# Altium footprint library Main_Board.PcbLib: 106 footprints (part 3 of 7)
Each footprint in its own frame and in the unit in brackets; x right, y up, seen from the top. Pads: shape width x height; smd on the part's side, far side on the other; paste and mask are expansions set on the pad; w line width, h text height; cw(c..) or ccw(c..) is an arc to the next point about the centre after c.
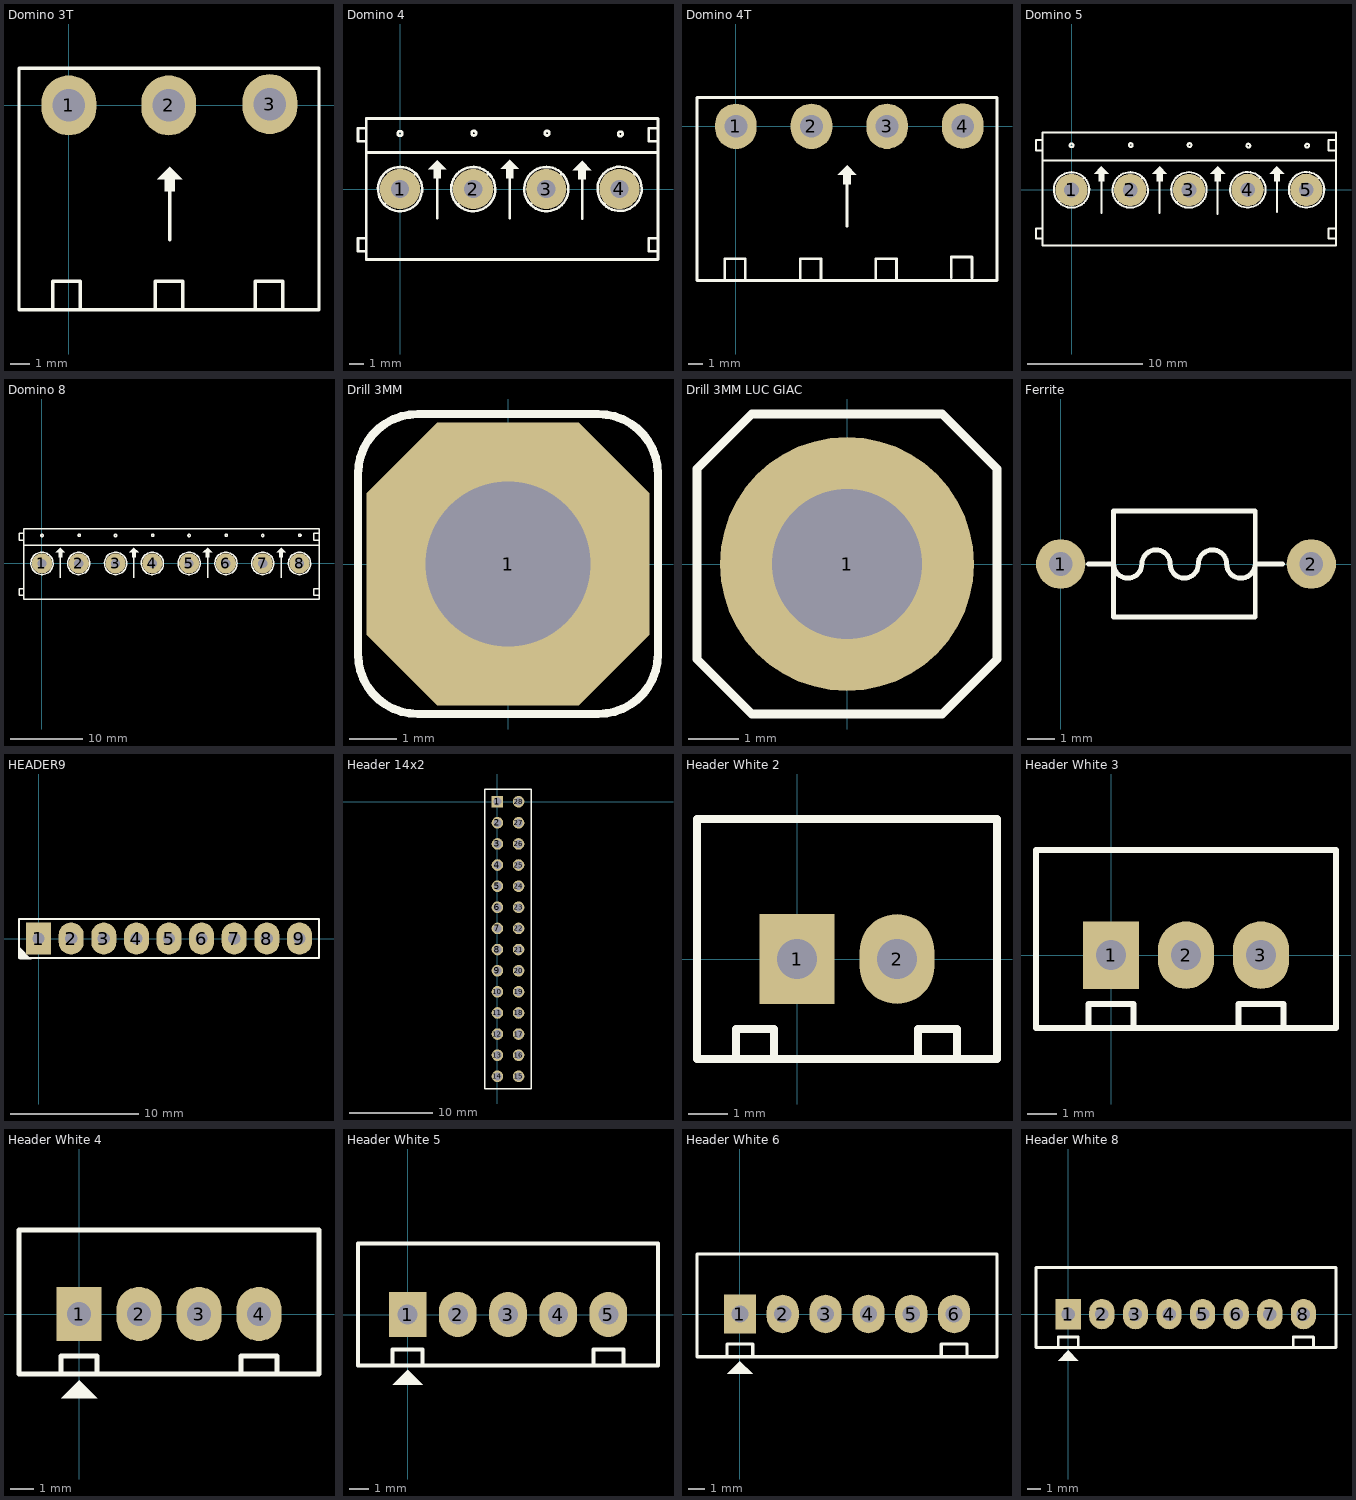
[diagram p2: the footprints below, top view; thin cyan lines are the x and y axes]

## Domino 3T [mil] "Domino 3T, 3 pin, hight 300mil, Pin to Pin 200, Colour Green"
height 300
pads (3):
  oval 110x120 hole 65: 1(0,0) 2(200,0) 3(402.62,2.62)
Top Overlay:
  region: 202,-122.5 177,-147.5 192,-147.5 192,-172.5 212,-172.5 212,-147.5 227,-147.5
  lines w7: -32,-407 -32,-352 23,-352 23,-407 ; 173,-407 173,-352 228,-352 228,-407 ; 202,-269 202,-172.5 ; 373,-407 373,-352 428,-352 428,-407 ; -100,-409 501,-409 501,74 -100,74 -100,-409
3D body "User Library-BigHeader 5EHDR_1P.step": height 124.02, standoff -366.97, extent -95,-404 101.85,68.44
3D body "User Library-BigHeader 5EHDR_1P.step": height 124.02, standoff -366.97, extent 102,-404 298.85,68.44
3D body "User Library-BigHeader 5EHDR_1P.step": height 124.02, standoff -366.97, extent 299,-404.22 495.85,68.22

## Domino 4 [mil] "Domino 4, 4 pin, height 300mil, Pin to Pin 200, Colour Green"
height 300
pads (4):
  round 110 hole 50: 1(0,0) 2(200,0) 3(400,0.06) 4(600,0.39)
Top Overlay:
  circle w7: c602.6,151 r6.4
  circle w7: c402,153 r6.4
  circle w7: c0,152 r6.4
  circle w7: c202,153 r6.4
  region: 300,80 275,55 290,55 290,30 310,30 310,55 325,55
  region: 102,79 77,54 92,54 92,29 112,29 112,54 127,54
  region: 498,77 473,52 488,52 488,27 508,27 508,52 523,52
  lines w7: -93,-169.5 -115,-169.5 -115,-134.5 -93,-134.5 ; -93,131 -115,131 -115,166 -93,166 ; -92.5,100 700,100 ; -42,-42 43,43 ; 39.04,46.05 ccw(c0,0) 45.18,40.05 ; 102,-79 102,72 ; 158,-42 242.5,42.5 ; 239.76,45.44 ccw(c200,0) 245.18,40.05 ; 300,-79 300,40 ; 358.5,-41.5 442.5,42.5 ; 439.27,45.97 ccw(c400.06,0.06) 445.19,40.17 ; 497.97,-81.03 497.97,69.97 ; 559,-41 643.5,43.5 ; 640.16,46.18 ccw(c600.59,0.59) 646.12,40.23 ; 702,-169.5 680,-169.5 680,-134.5 702,-134.5 ; 702,131 680,131 680,166 702,166 ; -92.5,-192.5 705.5,-192.5 705.5,193 -92.5,193 -92.5,-192.5
3D body "38268.stp": height 590.55, standoff -137.8, extent -109.84,-187.01 700,187.01

## Domino 4T [mil] "Domino 4T, 4 pin, hight 300mil, Pin to Pin 200, Colour Green"
height 300
pads (4):
  oval 110x120 hole 60: 1(0,0) 2(200,0) 3(400.06,0.06) 4(600.39,0.39)
Top Overlay:
  region: 294,-103 269,-128 284,-128 284,-153 304,-153 304,-128 319,-128
  lines w7: -30,-406 -30,-351 25,-351 25,-406 ; 170,-406 170,-351 225,-351 225,-406 ; 294,-265 294,-153 ; 370,-406 370,-351 425,-351 425,-406 ; 570,-401 570,-346 625,-346 625,-401 ; -103,-408 -103,76 691,76 691,-408 -103,-408
3D body "User Library-BigHeader 5EHDR_1P.step": height 139.98, standoff -351.01, extent -96.85,-402.44 100,70
3D body "User Library-BigHeader 5EHDR_1P.step": height 139.98, standoff -351.01, extent 293.15,-402.44 490,70
3D body "User Library-BigHeader 5EHDR_1P.step": height 139.98, standoff -351.01, extent 488.15,-402.44 685,70
3D body "User Library-BigHeader 5EHDR_1P.step": height 139.98, standoff -351.01, extent 98.15,-402.44 295,70

## Domino 5 [mil] "Domino 5, 5pin, hight 300mil, Pin to Pin 200, Colour Green"
height 300
pads (5):
  round 110 hole 50: 1(0,0) 2(200,0) 3(400,0.06) 4(600,0.39) 5(800,0.39)
Top Overlay:
  circle w7: c602.6,151 r6.4
  circle w7: c402,153 r6.4
  circle w7: c0,152 r6.4
  circle w7: c202,153 r6.4
  circle w7: c802.6,151 r6.4
  region: 700,80 675,55 690,55 690,30 710,30 710,55 725,55
  region: 498,80 473,55 488,55 488,30 508,30 508,55 523,55
  region: 102,80 77,55 92,55 92,30 112,30 112,55 127,55
  region: 300,80 275,55 290,55 290,30 310,30 310,55 325,55
  lines w7: -99,-166 -121,-166 -121,-131 -99,-131 ; -99,134.5 -121,134.5 -121,169.5 -99,169.5 ; -98,100 702,100 901,100 ; -42,-42 43,43 ; 39.04,46.05 ccw(c0,0) 45.18,40.05 ; 102,-79 102,72 ; 158,-42 242.5,42.5 ; 239.76,45.44 ccw(c200,0) 245.18,40.05 ; 300,-79 300,40 ; 358.5,-41.5 442.5,42.5 ; 439.27,45.97 ccw(c400.06,0.06) 445.19,40.17 ; 497.97,-81.03 497.97,69.97 ; 559,-41 643.5,43.5 ; 640.16,46.18 ccw(c600.59,0.59) 646.12,40.23 ; 700,-75 700,68 ; 759,-41 843.5,43.5 ; 840.16,46.18 ccw(c800.59,0.59) 846.12,40.23 ; 897,-166 875,-166 875,-131 897,-131 ; 897,134.5 875,134.5 875,169.5 897,169.5 ; -99,-189 -99,195.5 901,195.5 901,-189 -99,-189
3D body "hd2-508mm.stp": height 590.55, standoff -137.8, extent -115.94,-183.5 306.5,190.52
3D body "38267.stp": height 590.55, standoff -137.8, extent 283.5,-183.5 896.49,190.52

## Domino 8 [mil] "Domino 8, 8 pin, height 300mil, Pin to Pin 200, Colour Green"
height 300
pads (8):
  round 110 hole 50: 1(0,0) 2(200,0) 3(400,0) 4(600,0) 5(800,0) 6(1000,0) 7(1200,0) 8(1400,0)
Top Overlay:
  circle w7: c202,153 r6.4
  circle w7: c0,152 r6.4
  circle w7: c400,152 r6.4
  circle w7: c602,153 r6.4
  circle w7: c800,152 r6.4
  circle w7: c1002,153 r6.4
  circle w7: c1200,152 r6.4
  circle w7: c1402,153 r6.4
  region: 100,85 75,60 90,60 90,35 110,35 110,60 125,60
  region: 500,85 475,60 490,60 490,35 510,35 510,60 525,60
  region: 900,85 875,60 890,60 890,35 910,35 910,60 925,60
  region: 1300,85 1275,60 1290,60 1290,35 1310,35 1310,60 1325,60
  lines w7: -100,-173.5 -125,-173.5 -125,-137.5 -100,-137.5 ; -100,126.5 -125,126.5 -125,163 -100,163 ; -98,100 306,100 ; 38.83,46.23 ccw(c0,0) 40.11,45.12 ; 100,-79 100,72 ; 238.74,46.3 ccw(c200,0) 240.11,45.12 ; 300,-194.5 706,-194.5 ; 300,188.5 706,188.5 ; 302,100 706,100 ; 306,-194.5 -100,-194.5 -100,188.5 306,188.5 ; 438.83,46.23 ccw(c400,0) 440.11,45.12 ; 500,-79 500,72 ; 638.74,46.3 ccw(c600,0) 640.11,45.12 ; 700,-194.5 1106,-194.5 ; 700,188.5 1106,188.5 ; 702,100 1106,100 ; 838.83,46.23 ccw(c800,0) 840.11,45.12 ; 900,-79 900,72 ; 1038.74,46.3 ccw(c1000,0) 1040.11,45.12 ; 1100,-194.5 1506,-194.5 1506,188.5 1100,188.5 ; 1102,100 1506,100 ; 1238.83,46.23 ccw(c1200,0) 1240.11,45.12 ; 1300,-79 1300,72 ; 1438.74,46.3 ccw(c1400,0) 1440.11,45.12 ; 1502.5,-173.5 1477.5,-173.5 1477.5,-137.5 1502.5,-137.5 ; 1502.5,126.5 1477.5,126.5 1477.5,163 1502.5,163
3D body "hd2-508mm.stp": height 590.55, standoff -137.8, extent -121.22,-190 301.22,184.02
3D body "hd2-508mm.stp": height 590.55, standoff -137.8, extent 278.78,-190 701.22,184.02
3D body "hd2-508mm.stp": height 590.55, standoff -137.8, extent 678.78,-190 1101.22,184.02
3D body "hd2-508mm.stp": height 590.55, standoff -137.8, extent 1078.78,-190 1501.22,184.02

## Drill 3MM [mm]
pads (1):
  oct 6x6 hole 3.5: 1(0,0)
Top Overlay:
  lines w0.178: -3.175,-1.905 ccw(c-1.905,-1.905) -1.905,-3.175 1.905,-3.175 ccw(c1.905,-1.905) 3.175,-1.905 3.175,1.905 ccw(c1.905,1.905) 1.905,3.175 -1.905,3.175 ccw(c-1.905,1.905) -3.175,1.905 -3.175,-1.905

## Drill 3MM LUC GIAC [mil]
pads (1):
  round 200 hole 118.1: 1(0,0)
Top Overlay:
  lines w7: -118.11,-75 -75,-118.11 ; -118.11,-75 -118.11,75 -75,118.11 75,118.11 ; -118.11,-75 -75,-118.11 ; -75,-118.11 75,-118.11 ; 75,-118.11 118.11,-75 ; 75,-118.11 118.11,-75 ; 75,118.11 118.11,75 ; 75,118.11 118.11,75 ; 118.11,-75 118.11,75

## Ferrite [mil] "Ferrite Bead RH3.5x6x0.8"
pads (2):
  round 70 hole 33.46: 1(0,0) 2(355,0)
Top Overlay:
  lines w7: 39.37,0 75,0 ccw(c95,0) 95,-20 ccw(c95,0) 115,0 cw(c135,0) 135,20 cw(c135,0) 155,0 ccw(c175,0) 175,-20 ccw(c175,0) 195,0 cw(c215,0) 215,20 cw(c215,0) 235,0 ccw(c255,0) 255,-20 ccw(c255.3,0.3) 275.59,0 314.34,0 ; 75,-74.8 275.59,-74.8 275.59,74.8 75,74.8 75,-74.8
3D body "User Library-BL01RN1A1D2B-1.step": height 149.61, standoff -118.11, extent -11.96,-70.89 367.96,70.85

## HEADER9 [mm] "HDR9"
height 5.08
pads (9):
  rect 1.95x2.5 hole 0.95: 1(0,0)
  oval 1.95x2.5 hole 0.95: 2(2.54,0) 3(5.08,0) 4(7.62,0) 5(10.16,0) 6(12.7,0) 7(15.24,0) 8(17.78,0) 9(20.32,0)
Top Overlay:
  region: -1.473,-0.686 -1.473,-1.6 -0.584,-1.6 -0.559,-1.6
  lines w0.178: -1.524,-1.524 21.844,-1.524 21.844,1.524 -1.524,1.524 -1.524,-1.524
3D body "Header9_m.STEP": height 8.14, standoff -2.65, extent -1.27,-1.27 21.59,1.27

## Header 14x2 [mil] "Header Black Female 14x2 pin"
pads (28):
  rect 55x55 hole 38: 1(0,0)
  round 55 hole 38: 2(0,-100) 3(0,-200) 4(0,-300) 5(0,-400) 6(0,-500) 7(0,-600) 8(0,-700) 9(0,-800) 10(0,-900) 11(0,-1000) 12(0,-1100) 13(0,-1200) 14(0,-1300) 15(100,-1300) 16(100,-1200) 17(100,-1100) 18(100,-1000) 19(100,-900) 20(100,-800) 21(100,-700) 22(100,-600) 23(100,-500) 24(100,-400) 25(100,-300) 26(100,-200) 27(100,-100) 28(100,0)
Top Overlay:
  lines w7: -60,-1360 160,-1360 160,60 -60,60 -60,-1360
3D body "female_header_a-bl254-dg-g28d.stp": height 334.65, standoff -125.98, extent -48.43,-1354.92 148.43,54.93

## Header White 2 [mil] "JST Connector"
height 200
pads (2):
  rect 75x90 hole 40: 1(0,0)
  oval 75x90 hole 40: 2(100,0)
Top Overlay:
  lines w8: -61,-100 -61,-70 -23,-70 -23,-100 ; 121,-100 121,-70 160,-70 160,-100 ; -100,-100 -100,140 200,140 200,-100 -100,-100
3D body "User Library-B2B-XH-A.STEP": height 276.19, standoff -133.26, extent -95.67,-93.38 195.67,133

## Header White 3 [mil] "JST Connector"
height 200
pads (3):
  rect 75x90 hole 40: 1(0,0)
  oval 75x90 hole 40: 2(100,0) 3(200,0)
Top Overlay:
  lines w8: -30,-95 -30,-65 30,-65 30,-95 ; 170,-95 170,-65 230,-65 230,-95 ; -100,-97 300,-97 300,140 -100,140 -100,-97
3D body "User Library-B3B-XH-A.STEP": height 276.19, standoff -133.26, extent -94.88,-92.51 294.89,133.87

## Header White 4 [mil] "JST Connector"
height 200
pads (4):
  rect 75x90 hole 40: 1(0,0)
  oval 75x90 hole 40: 2(100,0) 3(200,0) 4(300,0)
Top Overlay:
  region: -30,-140 30,-140 0,-110
  lines w8: -30,-100 -30,-70 30,-70 30,-100 ; 270,-100 270,-70 330,-70 330,-100 ; -100,-100 -100,140 400,140 400,-100 -100,-100
3D body "User Library-B4B-XH-A.STEP": height 276.19, standoff -133.26, extent -94.09,-93.51 394.1,132.87

## Header White 5 [mil] "JST Connector"
height 200
pads (5):
  rect 75x90 hole 40: 1(0,0)
  oval 75x90 hole 40: 2(100,0) 3(200,0) 4(300,0) 5(400,0)
Top Overlay:
  region: -30,-140 30,-140 0,-110
  lines w8: -30,-100 -30,-70 30,-70 30,-100 ; 370,-100 370,-70 430,-70 430,-100 ; -99,-102 499,-102 499,142 -99,142 -99,-102
3D body "JST 5pin.stp": height 281, standoff -136, extent -93,-96.5 494,136

## Header White 6 [mil] "JST Connector"
height 200
pads (6):
  rect 75x90 hole 40: 1(0,0)
  oval 75x90 hole 40: 2(100,0) 3(200,0) 4(300,0) 5(400,0) 6(500,0)
Top Overlay:
  region: -30,-140 30,-140 0,-110
  lines w8: -30,-100 -30,-70 30,-70 30,-100 ; 470,-100 470,-70 530,-70 530,-100 ; -100,-100 600,-100 600,140 -100,140 -100,-100
3D body "User Library-B6B-XH-A.STEP": height 276.19, standoff -133.26, extent -92.52,-93.38 592.52,133

## Header White 8 [mil] "JST Connector"
height 200
pads (8):
  rect 75x90 hole 40: 1(0,0)
  oval 75x90 hole 40: 2(100,0) 3(200,0) 4(300,0) 5(400,0) 6(500,0) 7(600,0) 8(700,0)
Top Overlay:
  region: -30,-138 30,-138 0,-108
  lines w8: -30,-98 -30,-68 30,-68 30,-98 ; 670,-98 670,-68 730,-68 730,-98 ; -96,-99 -96,139 797,139 797,-99 -96,-99
3D body "User Library-B8B-XH-A.STEP": height 276.19, standoff -133.26, extent -89.94,-93.38 791.94,133